# Altium schematic symbol library lib_datalogger.SchLib: 1246 symbols (part 3 of 16)
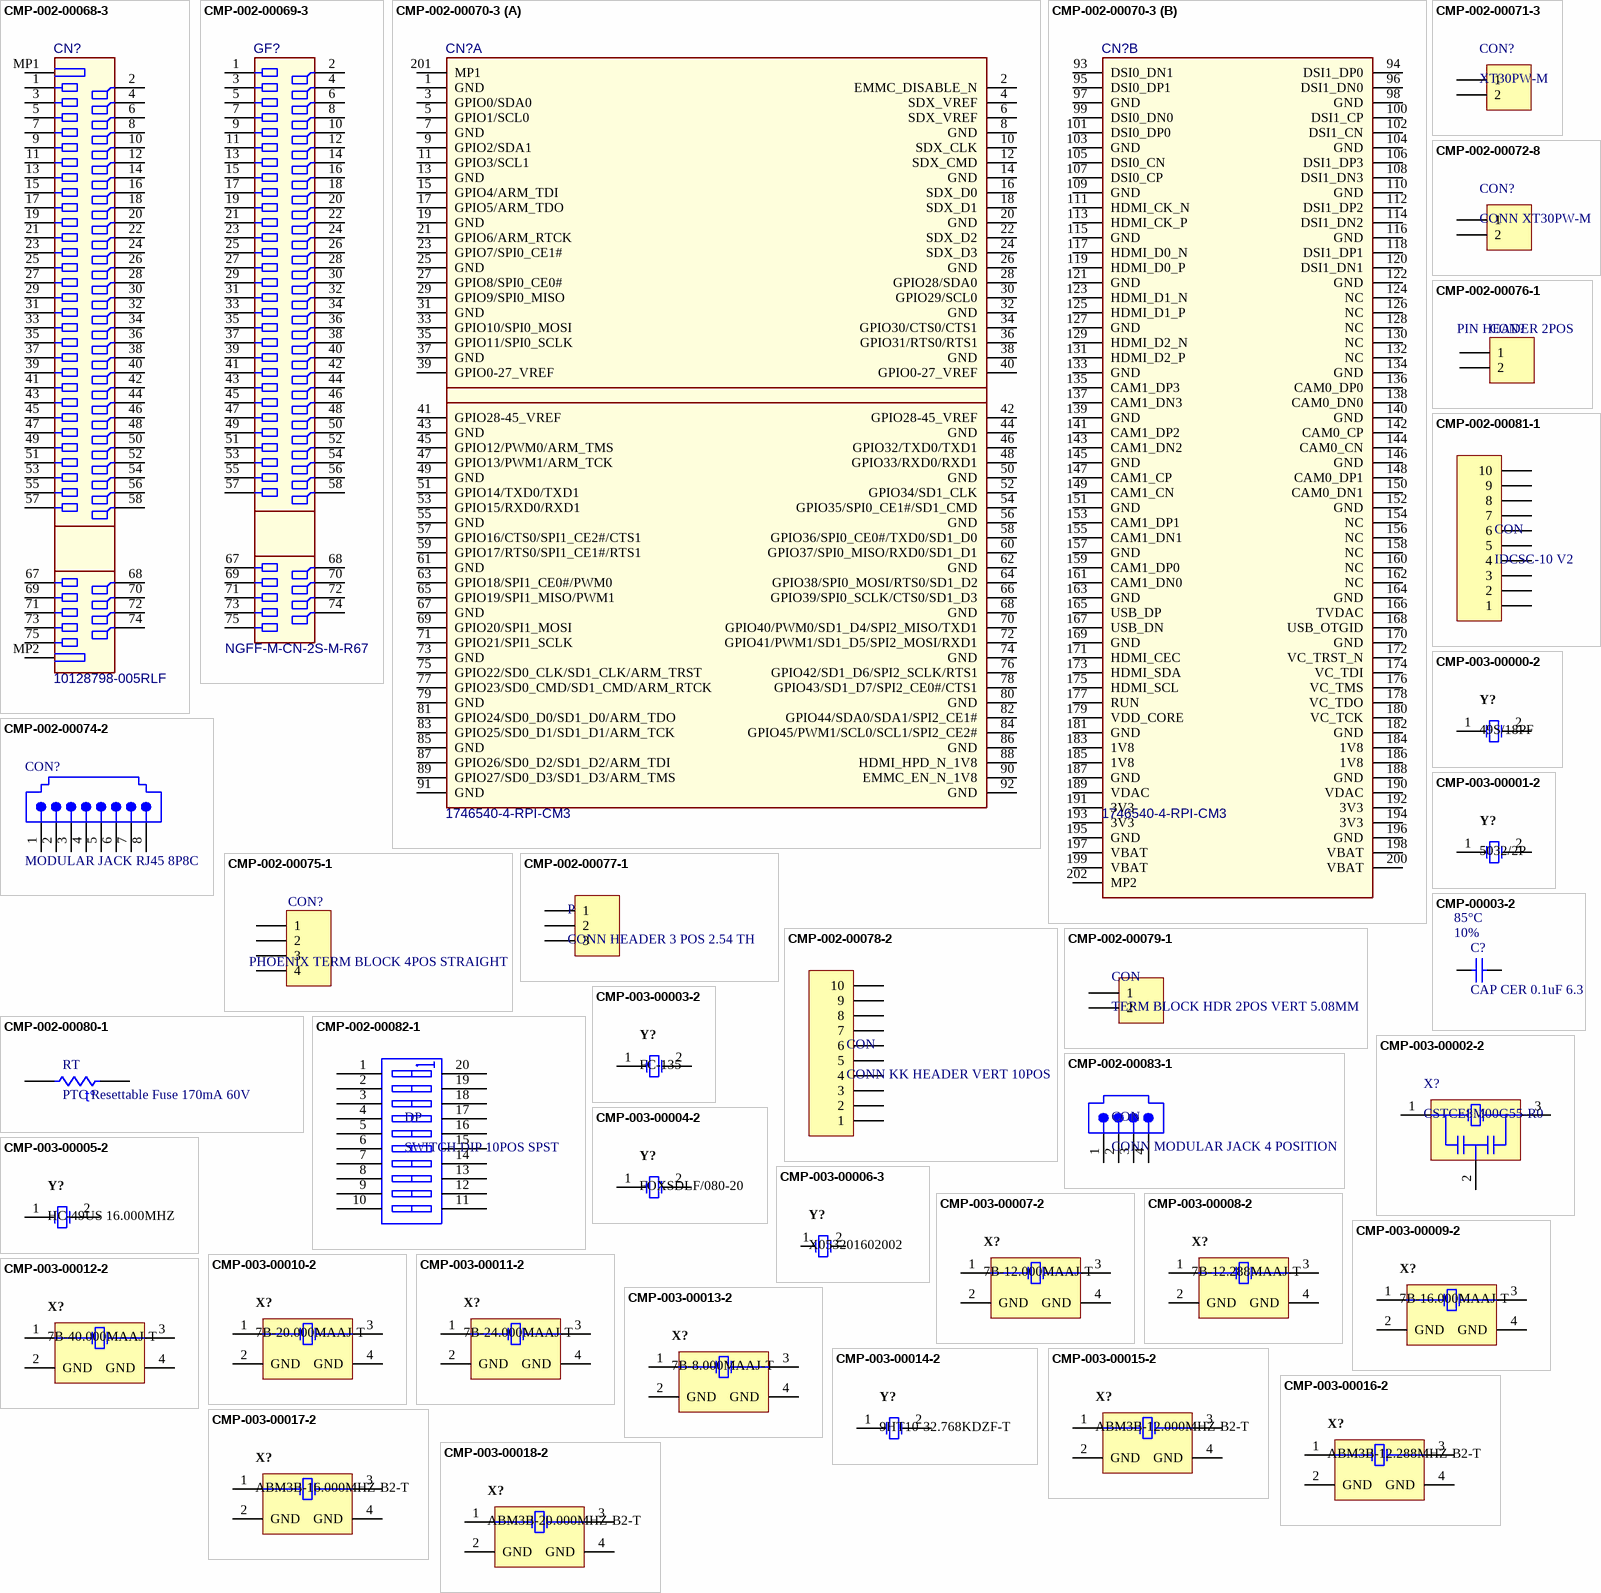
[diagram p45: symbols CMP-002-00068-3 to CMP-003-00018-2]

## CMP-002-00071-3
designator CON?, comment XT30PW-M
XT30PW Male, yellow; Manufacturer Part Number 1: XT60PW-M; Manufacturer 1: AMASS; current: 30A; Voltage: 500V; Supplier Part Number 1: XT60PW-M; Supplier Unit Price 1: 0,90; Supplier 1: Eletronic Components
footprint CONN XT30PW-M-Footprint-1
pins: 1, 2

## CMP-002-00072-8
designator CON?, comment CONN XT30PW-M
XT30PW-M Male, yellow; Manufacturer 1: AMASS; Manufacturer Part Number 1: XT60PW-M; current: 15A; Voltage: 500V; Supplier Part Number 1: XT60PW-M; Supplier 1: Eletronic Components; Supplier Unit Price 1: 0,55
footprint CONN XT30PW-M-Footprint-1
pins: 1, 2

## CMP-002-00074-2
designator CON?, comment MODULAR JACK RJ45 8P8C
Conn RJ-45 F 8 POS 1.02mm Solder RA Thru-Hole 8 Terminal 1 Port Cat 3 Box/Tube; PartNumber: TFN1-88P; Fornecedor - Sugerido: Metaltex; Number of Positions Loaded: 8; PCB Thickness: 1.57mm; Keyed: No; PCB Mounting Orientation: Right Angle; Shielding: Unshielded; Max Voltage Rating (AC): 150V; Element Configuration: Single; Pitch: 2.54mm; Tail Length: 3.8mm; Direction: Down; Number of Ports: 1; Observação: --; Fabricante - Sugerido: Metaltex; Connector Type: Jack; Housing Material: PBT; Number of Contacts: 8; Flammability Rating: UL94 V-0; Contact Plating: Gold; Packaging: Rail/Tube; ELV: Compliant; Max Operating Temperature: 70°C; Number of Rows: 1; Radiation Hardening: No; Termination: Solder; Orientation: Right Angle; Number of Positions: 8; Min Operating Temperature: -40°C; Housing Color: Black; Length: 15.44mm; Package Quantity: 37; Contact Material: Bronze; Depth: 18.42mm; RoHS Compliant: Yes
footprint Modular Jack 8
footprint MODULAR_JACK_RJ45_8P8C
pins: 1, 2, 3, 4, 5, 6, 7, 8

## CMP-002-00075-1
designator CON?, comment PHOENIX TERM BLOCK 4POS STRAIGHT
Terminal Header; 12 A; 250 V; 5.08 mm; 4; Solder Mount; 1.4 mm; 4 kV; 250 V; Manufacturer Part Number: 1755752; Voltage Rating (DC): 250V; Number of Contacts: 4; Connector Type: Plug; Current: 12A; Gender: Male; Pitch: 5.08mm; Approvals: UL,CSA,VDE,cULus,CB,EAC; Voltage: 300V; Number of Levels: 1; Contact Material: Tin; Contact Plating: Tin; Packaging: Bulk; Color: Green,Grey; Weight: 5.467464oz; Width: 22.32mm; Lead Free: Lead Free; Number of Positions Per Level: 4; Package Quantity: 50; Depth: 8.6mm; Housing Material: Polybutylene; Length: 22.32mm; RoHS Compliant: Yes; Number of Poles: 4; Number of Rows: 1; Housing Color: Green; Termination: Solder; Current Rating: 12A; Max Current Rating: 12A; Flammability Rating: UL94 V-0; Height: 15.9mm; REACH SVHC: No SVHC; Series: MSTBVA; Orientation: Straight; Mount: Through Hole; Number of Positions: 4; Voltage Rating: 250V
footprint CONN_STACKING_HEADER_4POS
footprint PHOE-1755752-4_V (TH, 4-Leads, Body 21.32x8.6mm, Pitch 5.08mm)
pins: 1, 2, 3, 4

## CMP-002-00076-1
designator CON?, comment PIN HEADER 2POS
Conn Unshrouded Header HDR 2 POS 2.54mm Solder ST Top Entry Thru-Hole Bulk; Manufacturer Part Number: TSW-102-07-G-S; Gender: Male; Connector Type: Male Pin; Max Current Rating: 7.6A; Number of Contacts: 2; Max Voltage Rating (AC): 550V; Length: 5.08mm; Depth: 2.54mm; Orientation: Straight; Termination: Solder; Packaging: Bulk; Number of Rows: 1; Contact Material: Bronze; Housing Color: Black; Pitch: 2.54mm; Contact Mating Length: 0.23inch; RoHS Compliant: Yes; Lead Free: Lead Free; Contact Type: Male Pin; Series: TSW; Contact Plating: Gold; Color: Black; Min Operating Temperature: -55°C; REACH SVHC: No SVHC; Housing Material: Polyester; Number of Positions: 2; Mount: Through Hole; Package Quantity: 1; Max Operating Temperature: 125°C
footprint FP-TSW-102-07-G-S-MFG
pins: 1, 2

## CMP-002-00077-1
designator P, comment CONN HEADER 3 POS 2.54 TH
CONN HEADER VERT SGL 3POS GOLD; Manufacturer Part Number: 961103-6404-AR; Number of Contacts: 3; Current Rating: 2A; Gender: Male; Pitch: 2.54mm; Contact Shape: Square; Housing Color: Black; Contact Material: Copper Alloy; Max Operating Temperature: 105°C; REACH SVHC: Unknown; Contact Gender: Male; Mount: Through Hole; Contact Mating Length: 0.22inch; Length: 7.62mm; Min Operating Temperature: -25°C; Contact Plating: Gold; Contact Type: Male Pin; Number of Rows: 1; Contact Finish - Mating: GOLD; Orientation: Straight; Connector Type: Header; RoHS Compliant: Yes; Depth: 2.5mm; Housing Material: Thermoplastic; Insulation Color: Black; Packaging: Bulk; Package Quantity: 3000; Insulation Material: Thermoplastic; Flammability Rating: UL94 V-0; Termination: Solder; Number of Positions: 3; Max Current Rating: 2A; Color: Black; Series: 961; Fastening Type: Pull
footprint 961103-6404-AR-Footprint-1
pins: 1, 2, 3

## CMP-002-00078-2
designator CON, comment CONN KK HEADER VERT 10POS
CONN KK HEADER VERT 10POS 2.54MM; Manufacturer Part Number: 0022112102; Contact Resistance: 10mR; Max Current Rating: 1A; Voltage Rating (DC): 250V; Number of Contacts: 10; Current Rating: 4A; Glow Wire Compliant: Non-compliant; Insulation Resistance: 50GR; Gender: Male; Length: 25.4mm; Housing Color: White; Min Operating Temperature: 0°C; Depth: 6.35mm; Lead Free: Contains Lead; Contact Material: Brass,Bronze; Orientation: Straight; Packaging: Bulk; Mount: Through Hole,Cable; REACH SVHC: Unknown; Halogen Free: Low Halogen; Housing Material: Nylon; Contact Plating: Gold,Tin; Color: White; Contact Type: Male Pin; Number of Rows: 1; Flammability Rating: UL94 V-0; Fastening Type: Friction; Height: 10.05mm; Number of Positions: 10; Series: KK® 6373; Radiation Hardening: No; Max Operating Temperature: 75°C; Package Quantity: 500; Number of Circuits: 10; Contact Mating Length: 0.295inch; Termination: Solder; Pitch: 2.54mm; Voltage Rating: 250V
footprint CONN KK HEADER VERT 10POS-Footprint-1
pins: 1, 2, 3, 4, 5, 6, 7, 8, 9, 10

## CMP-002-00079-1
designator CON, comment TERM BLOCK HDR 2POS VERT 5.08MM
TERM BLOCK HDR 2POS VERT 5.08MM MSTBVA; Manufacturer Part Number: 1755736; Connector Type: Plug; Voltage Rating: 250V; Voltage: 300V; Number of Contacts: 2; Current Rating: 12A; Number of Levels: 1; Gender: Male; Approvals: UL,CSA,VDE,cULus,CB,EAC; Weight: 5.467464oz; Termination: Solder; Housing Color: Green; Contact Material: Tin; Color: Green; Pitch: 5.08mm; Mount: Through Hole; Number of Positions Per Level: 2; Number of Rows: 1; Height: 12.16mm; Flammability Rating: UL94 V-0; Number of Poles: 2; Width: 15.9mm; REACH SVHC: No SVHC; Housing Material: Polybutylene; Depth: 8.6mm; Max Current Rating: 12A; Lead Free: Lead Free; Length: 12.16mm; RoHS Compliant: Yes; Number of Positions: 2; Orientation: Straight; Current: 12A; Contact Plating: Tin; Voltage Rating (DC): 250V; Packaging: Bulk; Series: MSTBVA; Package Quantity: 50
footprint 691311500102 (5,08mm - PCB Headers - Vertical - Closed ends -02p)
pins: 1, 2

## CMP-002-00080-1
designator RT, comment PTC Resettable Fuse 170mA 60V
PTC Resettable Fuse 0.17A(hold) 0.34A(trip) 60V 40A 0.48W 3s 2Ohm Radial; Manufacturer Part Number: MF-R017-AP; Lead Diameter: 0.51mm; Trip Current: 340mA; Power Dissipation: 480mW; Approvals: UL,CSA,TUV; Resistance: 3.2R; Number of Terminals/Pins: 2; Current Rating: 40A; Time to Trip: 3s; Lead Pitch: 5.1mm; Case/Package: Radial; Package Quantity: 2000; Max Operating Temperature: 85°C; RoHS Compliant: Yes; Termination: Radial; Number of Pins: 2; Voltage Rating (DC): 60V; Mount: Through Hole; Radiation Hardening: No; Min Operating Temperature: -40°C; Max Current Rating: 40A; Hold Current: 170mA; Series: MF-R; Packaging: Ammo Pack; Operating Supply Voltage: 60V
footprint MF-R017-AP-Footprint-1
pins: 1, 2
text: t°

## CMP-002-00081-1
designator CON, comment IDCSC-10 V2
CONN HEADER VERT 10POS GOLD; Manufacturer Part Number: 302-S101; Number of Positions: 10; Row Spacing: 0.1inch; Connector Type: Male Pin; Color: Black; Number of Rows: 2; Termination: Solder; Contact Type: Male Pin; Mount: Through Hole; Pitch: 0.1inch; Contact Plating: Gold; Series: 302; Packaging: Tray
footprint IDC10M
pins: 1, 2, 3, 4, 5, 6, 7, 8, 9, 10

## CMP-002-00082-1
designator DP, comment SWITCH DIP 10POS SPST
SWITCH SLIDE DIP SPST 50MA 24V; Manufacturer Part Number: 206-10ST; Electrical Life: 10000Cycles; Pitch: 0.1inch; Number of Positions: 10; Body Material: Plastic; Washable: Yes; Actuator Type: Slide (Standard); Contact Material: Copper Alloy; Contact Plating: Gold,Tin; Package Quantity: 20; Voltage Rating (DC): 24V; Radiation Hardening: No; Max Operating Temperature: 85°C; Throw Configuration: SPST; Orientation: Straight; Depth: 9.78mm; Max Voltage Rating (DC): 24V; Lead Free: Lead Free; Series: 206; Min Operating Temperature: -55°C; Length: 1.086inch; Packaging: Rail/Tube; RoHS Compliant: Yes; Max Current Rating: 50mA; Terminal Pitch: 2.54mm; Current Rating: 50mA; Mount: Through Hole; Termination: PC Pins
footprint SWITCH DIP 10POS SPST-Footprint-1
pins: 1, 2, 3, 4, 5, 6, 7, 8, 9, 10, 11, 12, 13, 14, 15, 16, 17, 18, 19, 20

## CMP-002-00083-1
designator CON, comment CONN MODULAR JACK 4 POSITION
Connector RJ45 Receptacle 4 Position Solder Straight Through Hole 1 Port Tray; Manufacturer Part Number: RJE1J1440410; Manufacturer: Amphenol; Mounting Angle: Vertical (Top Entry); Shielding: Shielded; Number of Ports: 1 Port; Number of Contacts: 4 Contact; Unit Weight: 0.257794 oz; Gender: Female; Termination Style: Through Hole; Contact Plating: Gold; Packaging: Tray; Contact Material: Phosphor Bronze; Mounting Style: Panel Mount; Number of Positions: 4 Position
footprint RJE1J1440410-Footprint-1
pins: 1, 2, 3, 4

## CMP-003-00000-2
designator Y?, comment 49S/18PF
Crystal, 16 MHz, +/-20 ppm, 18 pF, -20 to 70 degC, 2-Pin THD, RoHS; Manufacturer: Shenzhen Jingpengyuan; Frequency: 16MHz; Package Description: 2-Pin Through Hole Device, Body 11.05 x 4.65 mm, Pitch 4.88 mm; Mounting Technology: TH; Datasheet Version: Aug-14; Package Reference: 49S-18PF; RoHS Compliant: Unknown; Datasheet URL: http://datasheet.octopart.com/49S-18PF-Xinhunjing-datasheet-30677139.pdf; Case/Package: 49S-18PF; Manufacturer URL: http://www.chjiahui.com/
footprint JPY-49S-18PF (THD, 2-Leads, Body 11.05x4.65mm, Pitch 4.88mm)
pins: 1, 2

## CMP-003-00001-2
designator Y?, comment 5032/2P
SMD Quartz Crystal, 10 to 50 MHz, +/-30 ppm, 8 to 32 pF, 2-Pin SMD, RoHS, Tape and Reel; Manufacturer: NEWXTAL; RoHS Compliant: Unknown; Package Description: 2-Pin Surface Mount Device, Body 5 x 3.2 mm; Mounting Technology: SM; Manufacturer URL: http://www.newxtal.com/; Datasheet Version: Aug-09; Case/Package: 5032-2P; Package Reference: 5032-2P; Datasheet URL: http://www.newxtal.com/FILES/data/200984214656762.pdf
footprint NEWX-5032-2P_V (SMD, 2-Leads, Body 5x3.2mm)
pins: 1, 2

## CMP-00003-2
designator C?, comment CAP CER 0.1uF 6.3V X5R 10% SMD 0402  Tolerance: 10%  Max Operating Temperature: 85°C  RoHS Compliant: Yes  Voltage Rating: 6.3V  Lead Pitch: 0.3mm  Packaging: Tape and Reel  Min Operating Temperature: -55°C  Case/Package: 0402  Package Quantity: 1  Capacitance: 100nF
Cap Ceramic 0.1uF 6.3V X5R 10% SMD 0402 85C Paper T/R; Dissipation Factor: 5%; Construction: Flat; Case Code (Imperial): 0402; Depth: 0.5mm; Radiation Hardening: No; Height: 0.5mm; Series: C0402C; Lead Free: Lead Free; Width: 0.02inch; Dielectric Material: Ceramic; Thickness: 0.022inch; Case Code (Metric): 1005; Voltage: 6.3V; Voltage Rating (DC): 6.3V; Length: 1mm; Termination: SMD/SMT; Mount: Surface Mount,PCB; Dielectric: X5R; REACH SVHC: No SVHC
footprint CC1005-0402-3 (Chip Capacitor; Body 0.039" L x 0.020" W (1.00mm x 0.50mm))
pins: 1, 2
1 alternate drawing of the same symbol

## CMP-003-00002-2
designator X?, comment CSTCE8M00G55-R0
Ceramic Resonator, 8 MHz, +/- 0.5%, 30/33/39 pF, -20 to 80 degC, 3-Pin SMD, RoHS, Tape and Reel; Manufacturer: Murata; Impedance: 40Ohm; Frequency: 8MHz; Load Capacitance: 33pF; Packaging: TapeandReel; Datasheet URL: http://www.murata.com/~/media/webrenewal/support/library/catalog/products/timingdevice/ceralock/p16e.ashx; Package Reference: CSTCE_G_A-3; Min Operating Temperature: -20°C; Manufacturer URL: http://www.murata.com/; Pins: 3; Tolerance: 0.5%; Self Resonant Frequency: 8MHz; Package Description: 3-Pin Surface Mount Device, Body 3.2 x 1.3 mm, Pitch 1.2 mm; Mounting Technology: SM; RoHS Compliant: True; Datasheet Version: Dec-15; Package Quantity: 1; Case/Package: CSMD; Max Operating Temperature: 80°C; Frequency Tolerance: 0.5%
footprint MURA-CSTCE_G_A-3_V (SMD, 3-Leads, Body 3.2x1.3mm, Pitch 1.2mm)
pins: 1 X1, 2 GND (power), 3 X2

## CMP-003-00003-2
designator Y?, comment FC-135
Crystal Unit, 32 to 77.5 KHz, 0.5 to 1.3 pF, -40 to 85 degC, 2-Pin SMD, RoHS; Manufacturer: Epson; Manufacturer URL: https://www.eea.epson.com/; Datasheet URL: http://www5.epsondevice.com/en/products/khz_range/fc135r.html#; Mounting Technology: SM; Package Description: 2-Pin Surface Mount Device, Body 3.2 x 1.5 mm; Datasheet Version: Feb-15; Package Reference: FC-135; RoHS Compliant: False; Case/Package: FC-135
footprint EPSON-FC-135_V (SMD, 2-Leads, Body 3.2x1.5mm)
pins: 1, 2

## CMP-003-00004-2
designator Y?, comment FOXSDLF/080-20
Resistance Weld Crystal, 8 MHz, +/- 30 ppm, 20 pF, -20 to 70 degC, 2-Pin SMD, RoHS, Tape and Reel; Manufacturer: FOX Electronics; Resistance: 80Ohm; Load Capacitance: 20pF; ESR: 80; Frequency: 8MHz; Frequency Tolerance: 30ppm; Tolerance: 50ppm; Max Operating Temperature: 70°C; Pins: 2; Case/Package: HC49SDLF; Min Operating Temperature: -20°C; Mounting Technology: SM; Packaging: CutTape; Package Description: 2-Pin Surface Mount Device, Body 5 x 11.7 mm; RoHS Compliant: True; Package Reference: HC49SDLF; Package Quantity: 1; Manufacturer URL: http://www.foxonline.com/; Datasheet Version: Mar-15; Datasheet URL: http://www.foxonline.com/pdfs/hc49sdlf.pdf
footprint FOX-HC49SDLF_V (SMD, 2-Leads, Body 5x11.7mm)
pins: 1, 2

## CMP-003-00005-2
designator Y?, comment HC-49US 16.000MHZ
Crystal, 16 MHz, +/- 30 ppm, 18 pF, -20 to 70 degC, 2-Pin THD; Manufacturer: Jing peng yuan; Frequency: 16MHz; Package Reference: HC-49US; Case/Package: HC-49US; RoHS Compliant: Unknown; Mounting Technology: TH; Package Description: 2-Pin Throug Hole Device, Body 11.05 x 4.65 mm, Pitch 4.9 mm; Datasheet URL: https://statics3.seeedstudio.com/images/opl/datasheet/306010014.pdf; Datasheet Version: May-15
footprint JPY-HC-49US (THD, 2-Leads, Body 11.05x4.65mm, Pitch 4.9mm)
pins: 1, 2

## CMP-003-00006-3
designator Y?, comment X053201602002
SMD Crystal, 16 MHz, +/- 20 ppm, 8 pF, -20 to 70 degC, 2-Pin SMD; Manufacturer: Shenzhen Jingpengyuan; Frequency: 16MHz; Mounting Technology: SM; Package Description: 2-Pin Surface Mount Device, Body 5 x 3.2 mm; Case/Package: X053201602002; Datasheet Version: May-13; RoHS Compliant: Unknown; Package Reference: X053201602002; Datasheet URL: http://datasheet.octopart.com/X053201602002-Jingpengyuan-datasheet-62330935.pdf; Manufacturer URL: http://www.chjiahui.com/
footprint JPY-X053201602002_V (SMD, 2-Leads, Body 5x3.2mm)
footprint JPY-X053201602002_V-5 (SMD, 2-Leads, Body 5x3.2mm)
pins: 1, 2

## CMP-003-00007-2
designator X?, comment 7B-12.000MAAJ-T
SMD Seam Sealing Crystal, 12 MHz, +/- 30 ppm, 18 pF, -10 to 70 degC, 4-Pin SMD, RoHS, Tape and Reel; Manufacturer: TXC; Frequency: 12MHz; Tolerance: 30ppm; Resistance: 100Ohm; ESR: 40; Load Capacitance: 18pF; Package Quantity: 1; Pins: 4; Datasheet URL: http://www.txccorp.com/download/products/quartz_crystals/2015TXC_7B_19.pdf; Case/Package: 7B-4; Max Operating Temperature: 70°C; Packaging: TapeandReel; Package Description: 4-Pin Surface Mount Device, Body 5 x 3.2 mm, Pitch 3.7 mm; Frequency Tolerance: 30ppm; RoHS Compliant: True; Mounting Technology: SM; Package Reference: 7B-4; Min Operating Temperature: -20°C; Datasheet Version: Jul-15
footprint TXC-7B-4_V (SMD, 4-Leads, Body 5x3.2mm, Pitch 3.7mm)
pins: 1 X1, 2 GND (power), 3 X2, 4 GND (power)

## CMP-003-00008-2
designator X?, comment 7B-12.288MAAJ-T
SMD Seam Sealing Crystal, 12.288 MHz, +/- 30 ppm, 18 pF, -10 to 70 degC, 4-Pin SMD, RoHS, Tape and Reel; Manufacturer: TXC; Frequency Tolerance: 30ppm; ESR: 40; Load Capacitance: 18pF; Datasheet URL: http://www.txccorp.com/download/products/quartz_crystals/2015TXC_7B_19.pdf; Case/Package: 7B-4; Min Operating Temperature: -20°C; Package Reference: 7B-4; Datasheet Version: Jul-15; Tolerance: 30ppm; Packaging: TapeandReel; Mounting Technology: SM; Max Operating Temperature: 70°C; Package Quantity: 1000; RoHS Compliant: True; Pins: 4; Package Description: 4-Pin Surface Mount Device, Body 5 x 3.2 mm, Pitch 3.7 mm; Frequency: 12.288MHz
footprint TXC-7B-4_V (SMD, 4-Leads, Body 5x3.2mm, Pitch 3.7mm)
pins: 1 X1, 2 GND (power), 3 X2, 4 GND (power)

## CMP-003-00009-2
designator X?, comment 7B-16.000MAAJ-T
SMD Seam Sealing Crystal, 16 MHz, +/- 30 ppm, 18 pF, -10 to 70 degC, 4-Pin SMD, RoHS, Tape and Reel; Manufacturer: TXC; ESR: 40; Resistance: 40Ohm; Frequency: 16MHz; Tolerance: 30ppm; Load Capacitance: 18pF; Datasheet Version: Jul-15; Datasheet URL: http://www.txccorp.com/download/products/quartz_crystals/2015TXC_7B_19.pdf; Min Operating Temperature: -10°C; Case/Package: 7B-4; Package Description: 4-Pin Surface Mount Device, Body 5 x 3.2 mm, Pitch 3.7 mm; RoHS Compliant: True; Mounting Technology: SM; Max Operating Temperature: 70°C; Package Reference: 7B-4; Package Quantity: 1000; Packaging: TapeandReel; Pins: 4; Frequency Tolerance: 30ppm
footprint TXC-7B-4_V (SMD, 4-Leads, Body 5x3.2mm, Pitch 3.7mm)
pins: 1 X1, 2 GND (power), 3 X2, 4 GND (power)

## CMP-003-00010-2
designator X?, comment 7B-20.000MAAJ-T
SMD Seam Sealing Crystal, 20 MHz, +/- 30 ppm, 18 pF, -10 to 70 degC, 4-Pin SMD, RoHS, Tape and Reel; Manufacturer: TXC; Tolerance: 30ppm; Resistance: 40Ohm; Load Capacitance: 18pF; Frequency: 20MHz; ESR: 40; Package Reference: 7B-4; Mounting Technology: SM; RoHS Compliant: True; Package Quantity: 1000; Package Description: 4-Pin Surface Mount Device, Body 5 x 3.2 mm, Pitch 3.7 mm; Case/Package: 7B-4; Pins: 4; Datasheet Version: Jul-15; Datasheet URL: http://www.txccorp.com/download/products/quartz_crystals/2015TXC_7B_19.pdf; Packaging: TapeandReel; Frequency Tolerance: 30ppm; Min Operating Temperature: -20°C; Max Operating Temperature: 70°C
footprint TXC-7B-4_V (SMD, 4-Leads, Body 5x3.2mm, Pitch 3.7mm)
pins: 1 X1, 2 GND (power), 3 X2, 4 GND (power)

## CMP-003-00011-2
designator X?, comment 7B-24.000MAAJ-T
SMD Seam Sealing Crystal, 24 MHz, +/- 30 ppm, 18 pF, -10 to 70 degC, 4-Pin SMD, RoHS, Tape and Reel; Manufacturer: TXC; Resistance: 40Ohm; Frequency: 24MHz; Tolerance: 30ppm; ESR: 40; Load Capacitance: 18pF; Package Description: 4-Pin Surface Mount Device, Body 5 x 3.2 mm, Pitch 3.7 mm; Pins: 4; Mounting Technology: SM; Package Reference: 7B-4; Max Operating Temperature: 70°C; Package Quantity: 1000; Min Operating Temperature: -20°C; Datasheet URL: http://www.txccorp.com/download/products/quartz_crystals/2015TXC_7B_19.pdf; RoHS Compliant: True; Datasheet Version: Jul-15; Case/Package: 7B-4; Packaging: TapeandReel; Frequency Tolerance: 30ppm
footprint TXC-7B-4_V (SMD, 4-Leads, Body 5x3.2mm, Pitch 3.7mm)
pins: 1 X1, 2 GND (power), 3 X2, 4 GND (power)

## CMP-003-00012-2
designator X?, comment 7B-40.000MAAJ-T
9B Series Quartz Crystal, 40 MHz, +/-30 ppm, 18 pF, -40 to 85 degC, 4-Pin SMD, RoHS, Tape and Reel; Manufacturer: TXC; Tolerance: 30ppm; Resistance: 40Ohm; ESR: 40; Frequency: 40MHz; Load Capacitance: 18pF; Package Quantity: 1; RoHS Compliant: True; Case/Package: 7B-4; Datasheet Version: Jan-10; Packaging: TapeandReel; Package Description: 4-Pin Surface Mount Device, Body 5 x 3.2 mm, Pitch 3.7 mm; Frequency Tolerance: 30ppm; Pins: 4; Datasheet URL: http://www.txccrystal.com/images/pdf/7b.pdf; Max Operating Temperature: 70°C; Min Operating Temperature: -20°C; Mounting Technology: SM; Package Reference: 7B-4
footprint TXC-7B-4_V (SMD, 4-Leads, Body 5x3.2mm, Pitch 3.7mm)
pins: 1 X1, 2 GND (power), 3 X2, 4 GND (power)

## CMP-003-00013-2
designator X?, comment 7B-8.000MAAJ-T
SMD Seam Sealing Crystal, 8 MHz, +/- 30 ppm, 18 pF, -10 to 70 degC, 4-Pin SMD, RoHS, Tape and Reel; Manufacturer: TXC; Frequency: 8MHz; Resistance: 100Ohm; Tolerance: 30ppm; Load Capacitance: 18pF; ESR: 100; Package Quantity: 1000; Datasheet URL: http://www.txccorp.com/download/products/quartz_crystals/2015TXC_7B_19.pdf; Case/Package: 7B-4; Packaging: TapeandReel; Frequency Tolerance: 30ppm; Min Operating Temperature: -20°C; RoHS Compliant: True; Package Reference: 7B-4; Mounting Technology: SM; Datasheet Version: Jul-15; Max Operating Temperature: 70°C; Package Description: 4-Pin Surface Mount Device, Body 5 x 3.2 mm, Pitch 3.7 mm; Pins: 4
footprint TXC-7B-4_V (SMD, 4-Leads, Body 5x3.2mm, Pitch 3.7mm)
pins: 1 X1, 2 GND (power), 3 X2, 4 GND (power)

## CMP-003-00014-2
designator Y?, comment 9HT10-32.768KDZF-T
Tuning Fork, 32.768 KHz, +/-20 ppm, 12.5 pF, -40 to 85 degC, 2-Pin SMD, RoHS, Tape and Reel; Manufacturer: TXC; Load Capacitance: 12.5pF; Tolerance: 20ppm; Resistance: 70000Ohm; ESR: 70k; Package Reference: 9HT10; Frequency: 32.768kHz; Package Description: 2-Pin Surface Mount Device, Body 3.2 x 1.5 mm; Case/Package: 9HT10; Max Operating Temperature: 85°C; RoHS Compliant: True; Frequency Tolerance: 20ppm; Package Quantity: 1; Datasheet URL: http://www.txccrystal.com/images/pdf/9ht10.pdf; Pins: 2; Datasheet Version: Jun-11; Mounting Technology: SM; Packaging: TapeandReel; Min Operating Temperature: -40°C
footprint TXC-9HT10_V (SMD, 2-Leads, Body 3.2x1.5mm)
pins: 1, 2

## CMP-003-00015-2
designator X?, comment ABM3B-12.000MHZ-B2-T
Ceramic SMD Crystal, 12 MHz, +/- 20 ppm, 18 pF, -20 to 70 degC, 4-Pin SMD, RoHS, Tape and Reel; Manufacturer: Abracon; ESR: 70; Load Capacitance: 18pF; Tolerance: 20ppm; Frequency: 12MHz; Resistance: 70Ohm; Mounting Technology: SM; Packaging: TapeandReel; Datasheet URL: http://www.abracon.com/Resonators/abm3b.pdf; Manufacturer URL: http://www.abracon.com/; RoHS Compliant: True; Frequency Tolerance: 20ppm; Datasheet Version: Aug-15; Max Operating Temperature: 70°C; Package Reference: ABM3B; Min Operating Temperature: -20°C; Pins: 4; Package Quantity: 1000; Package Description: 4-Pin Surface Mount Device, Body 5 x 3.2 mm; Case/Package: CSMD
footprint ABRA-ABM3B-4_V (SMD, 4-Leads, Body 5x3.2mm)
pins: 1 X1, 2 GND (power), 3 X2, 4 GND (power)

## CMP-003-00016-2
designator X?, comment ABM3B-12.288MHZ-B2-T
Ceramic SMD Crystal, 12.288 MHz, +/- 20 ppm, 18 pF, -20 to 70 degC, 4-Pin SMD, RoHS, Tape and Reel; Manufacturer: Abracon; Load Capacitance: 18pF; Frequency Tolerance: 20ppm; Resistance: 70Ohm; ESR: 70; Manufacturer URL: http://www.abracon.com/; Datasheet URL: http://www.abracon.com/Resonators/abm3b.pdf; Frequency: 12.288MHz; Min Operating Temperature: -20°C; RoHS Compliant: True; Case/Package: CSMD; Packaging: TapeandReel; Package Reference: ABM3B; Package Description: 4-Pin Surface Mount Device, Body 5 x 3.2 mm; Tolerance: 20ppm; Max Operating Temperature: 70°C; Datasheet Version: Aug-15; Mounting Technology: SM; Package Quantity: 1000; Pins: 4
footprint ABRA-ABM3B-4_V (SMD, 4-Leads, Body 5x3.2mm)
pins: 1 X1, 2 GND (power), 3 X2, 4 GND (power)

## CMP-003-00017-2
designator X?, comment ABM3B-16.000MHZ-B2-T
Ceramic SMD Crystal, 16 MHz, +/- 20 ppm, 18 pF, -20 to 70 degC, 4-Pin SMD, RoHS, Tape and Reel; Manufacturer: Abracon; Tolerance: 20ppm; Load Capacitance: 18pF; Frequency: 16MHz; Resistance: 50Ohm; ESR: 50; Max Operating Temperature: 70°C; Frequency Tolerance: 20ppm; Min Operating Temperature: -20°C; Packaging: TapeandReel; Manufacturer URL: http://www.abracon.com/; Package Quantity: 1000; Datasheet URL: http://www.abracon.com/Resonators/abm3b.pdf; Package Description: 4-Pin Surface Mount Device, Body 5 x 3.2 mm; Pins: 4; Package Reference: ABM3B; Datasheet Version: Aug-15; Case/Package: CSMD; Mounting Technology: SM; RoHS Compliant: True
footprint ABRA-ABM3B-4_V (SMD, 4-Leads, Body 5x3.2mm)
pins: 1 X1, 2 GND (power), 3 X2, 4 GND (power)

## CMP-003-00018-2
designator X?, comment ABM3B-20.000MHZ-B2-T
Ceramic SMD Crystal, 20 MHz, +/- 20 ppm, 18 pF, -20 to 70 degC, 4-Pin SMD, RoHS, Tape and Reel; Manufacturer: Abracon; Resistance: 50Ohm; ESR: 50; Tolerance: 20ppm; Frequency: 20MHz; Load Capacitance: 18pF; Package Description: 4-Pin Surface Mount Device, Body 5 x 3.2 mm; Package Quantity: 1; Case/Package: CSMD; Mounting Technology: SM; Packaging: TapeandReel; Pins: 4; Package Reference: ABM3B; Max Operating Temperature: 70°C; Datasheet Version: Aug-15; Min Operating Temperature: -20°C; Frequency Tolerance: 20ppm; Manufacturer URL: http://www.abracon.com/; Datasheet URL: http://www.abracon.com/Resonators/abm3b.pdf; RoHS Compliant: True
footprint ABRA-ABM3B-4_V (SMD, 4-Leads, Body 5x3.2mm)
pins: 1 X1, 2 GND (power), 3 X2, 4 GND (power)
